# Altium integrated library MATE-ROV_LIB.IntLib: 59 symbols
Pins are listed as number, name and electrical type; pins without a type are passive.

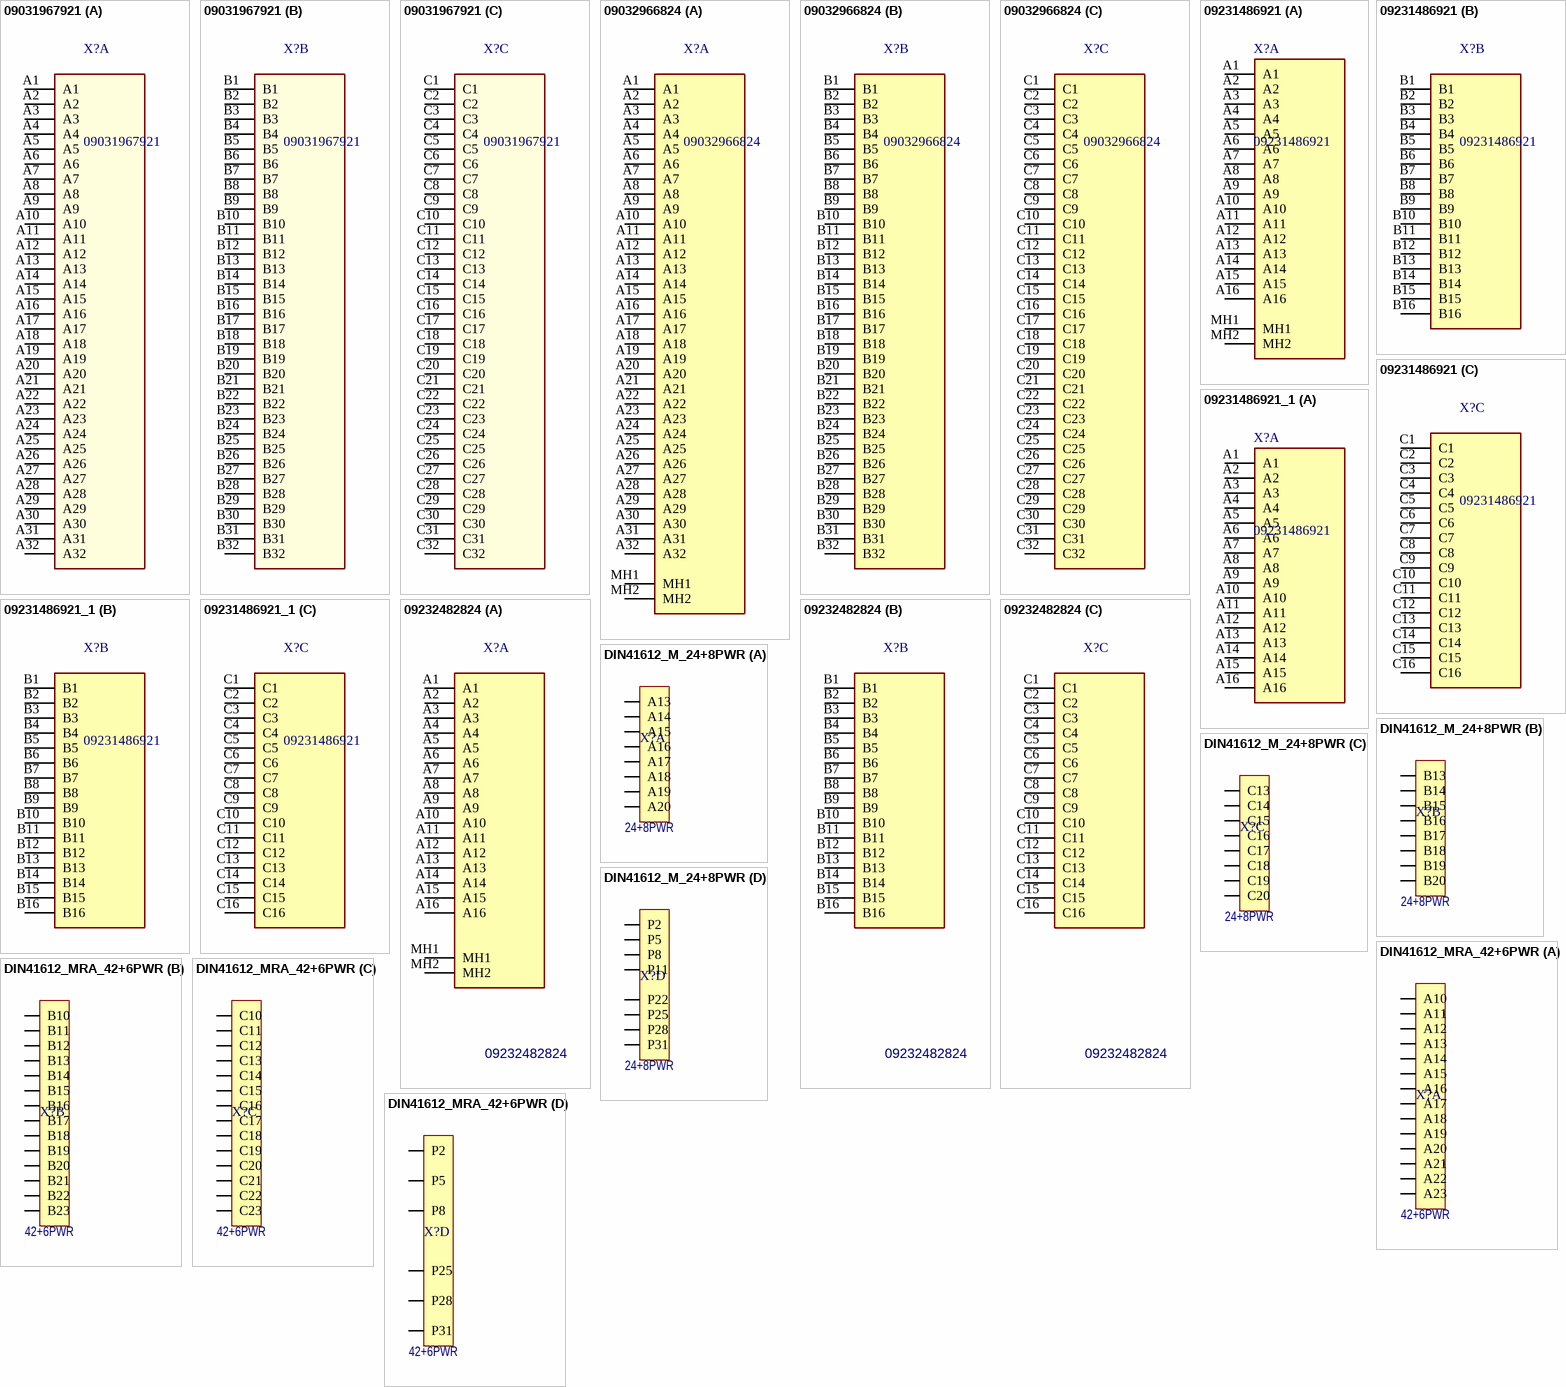
[diagram p0: symbols 09031967921 to DIN41612_MRA_42+6PWR]

## 09031967921
designator X?
DIN C male angled, 96pin, PL1, NFF F1-I2; Manufacturer: HARTING; Geometry.Height: 11.1mm; Ordering Number: 09031967921; Mouser Part Number: 617-09031962921222; Mouser Price/Stock: https://www.mouser.co.uk/ProductDetail/HARTING/09031962921222?qs=g4r0utqXwHHoAd6j7T8voA%3D%3D; Arrow Part Number: 09031962921222; Arrow Price/Stock: https://www.arrow.com/en/products/09031962921222/harting?region=nac; Datasheet Link: https://b2b.harting.com/files/download/PRD/PDF_DS/PDF_DS_09031220202.pdf
footprint 09031962921222
part A pins: A1, A2, A3, A4, A5, A6, A7, A8, A9, A10, A11, A12, A13, A14, A15, A16, A17, A18, A19, A20, A21, A22, A23, A24, A25, A26, A27, A28, A29, A30, A31, A32
part B pins: B1, B2, B3, B4, B5, B6, B7, B8, B9, B10, B11, B12, B13, B14, B15, B16, B17, B18, B19, B20, B21, B22, B23, B24, B25, B26, B27, B28, B29, B30, B31, B32
part C pins: C1, C2, C3, C4, C5, C6, C7, C8, C9, C10, C11, C12, C13, C14, C15, C16, C17, C18, C19, C20, C21, C22, C23, C24, C25, C26, C27, C28, C29, C30, C31, C32

## 09032966824
designator X?
DIN C female straight 96pin, 2.9mm tails, PL2; Manufacturer: HARTING; Geometry.Height: 11.6mm; Ordering Number: 09032966824; Mouser Part Number: 617-09-03-296-6824; Mouser Price/Stock: https://www.mouser.co.uk/ProductDetail/HARTING/09032966824?qs=UV5Tb6pF94W6%2F4%252Bfx4iLqQ%3D%3D; Arrow Part Number: 09032966824; Arrow Price/Stock: https://www.arrow.com/en/products/09032966824/harting?region=europe; Datasheet Link: https://b2b.harting.com/files/download/PRD/PDF_DS/PDF_DS_09032100001.pdf
footprint 09032966824
part A pins: A1, A2, A3, A4, A5, A6, A7, A8, A9, A10, A11, A12, A13, A14, A15, A16, A17, A18, A19, A20, A21, A22, A23, A24, A25, A26, A27, A28, A29, A30, A31, A32, MH1, MH2
part B pins: B1, B2, B3, B4, B5, B6, B7, B8, B9, B10, B11, B12, B13, B14, B15, B16, B17, B18, B19, B20, B21, B22, B23, B24, B25, B26, B27, B28, B29, B30, B31, B32
part C pins: C1, C2, C3, C4, C5, C6, C7, C8, C9, C10, C11, C12, C13, C14, C15, C16, C17, C18, C19, C20, C21, C22, C23, C24, C25, C26, C27, C28, C29, C30, C31, C32

## 09231486921
designator X?
DIN 2C male straight 48pin; Manufacturer: HARTING; Geometry.Height: 11mm; Ordering Number: 09231486921; Mouser Part Number: *; Mouser Price/Stock: *; Arrow Part Number: 09 23 148 6921; Arrow Price/Stock: https://www.arrow.com/en/products/09231486921/harting; Datasheet Link: https://www.arrow.com/en/products/09231486921/harting
footprint 09231486921
part A pins: A1, A2, A3, A4, A5, A6, A7, A8, A9, A10, A11, A12, A13, A14, A15, A16, MH1, MH2
part B pins: B1, B2, B3, B4, B5, B6, B7, B8, B9, B10, B11, B12, B13, B14, B15, B16
part C pins: C1, C2, C3, C4, C5, C6, C7, C8, C9, C10, C11, C12, C13, C14, C15, C16

## 09231486921_1
designator X?, comment 09231486921
DIN 2C male straight 48pin / Without Mounting Holes for screws.; Manufacturer: HARTING; Geometry.Height: 11mm; Ordering Number: 09231486921; Mouser Part Number: *; Mouser Price/Stock: *; Arrow Part Number: 09 23 148 6921; Arrow Price/Stock: https://www.arrow.com/en/products/09231486921/harting; Datasheet Link: https://www.arrow.com/en/products/09231486921/harting
footprint 09231486921 - no Mounting Holes
part A pins: A1, A2, A3, A4, A5, A6, A7, A8, A9, A10, A11, A12, A13, A14, A15, A16
part B pins: B1, B2, B3, B4, B5, B6, B7, B8, B9, B10, B11, B12, B13, B14, B15, B16
part C pins: C1, C2, C3, C4, C5, C6, C7, C8, C9, C10, C11, C12, C13, C14, C15, C16

## 09232482824
designator X?
DIN 2C female straight 48pin, 2.9mm tails, PL1; Manufacturer: HARTING; Geometry.Height: 11.6mm; Ordering Number: 09232482824; Mouser Part Number: 617-09232482824; Mouser Price/Stock: https://www.mouser.co.uk/ProductDetail/HARTING/09232482824?qs=Afqhj6cPmO8bPFy5EsJjEQ%3D%3D; Arrow Part Number: *; Arrow Price/Stock: *; Datasheet Link: https://b2b.harting.com/files/download/PRD/PDF_DS/PDF_DS_09032100001.pdf
footprint 09232482824
footprint Model Name (Model Description)
part A pins: A1, A2, A3, A4, A5, A6, A7, A8, A9, A10, A11, A12, A13, A14, A15, A16, MH1, MH2
part B pins: B1, B2, B3, B4, B5, B6, B7, B8, B9, B10, B11, B12, B13, B14, B15, B16
part C pins: C1, C2, C3, C4, C5, C6, C7, C8, C9, C10, C11, C12, C13, C14, C15, C16

## DIN41612_M_24+8PWR
designator X?, comment 24+8PWR
DIN 41612 Bauform M 24+8 Federleiste mit Powerkontakten; Manufacturer: Harting; € / St.: 54,00; Ordering Number: 09032246804 + 8x 09030006104; ComponentLink1Description: Datasheet; ComponentLink1URL: D:\Prj\_Altium\IntLib_leh2fe\DS\Harting\DIN41612_Steckverbinder.pdf; ComponentLink2URL: D:\Prj\_Altium\IntLib_leh2fe\DS\Harting\0903224X805_100072218DRW027A.pdf; ComponentLink2Description: Drawing1; Value: 24+8PWR
footprint DIN 41612 24+8 (Female Connector Type M 24+8)
part A pins: A13, A14, A15, A16, A17, A18, A19, A20
part B pins: B13, B14, B15, B16, B17, B18, B19, B20
part C pins: C13, C14, C15, C16, C17, C18, C19, C20
part D pins: 2 P2, 5 P5, 8 P8, 11 P11, 22 P22, 25 P25, 28 P28, 31 P31

## DIN41612_MRA_42+6PWR
designator X?, comment 42+6PWR
DIN 41612 Bauform M 42+6 Messerleiste mit Powerkontakten; Manufacturer: Harting; € / St.: 48,00; Ordering Number: 09031426901 + 6x 09030006104; ComponentLink1Description: Datasheet; ComponentLink1URL: D:\Prj\_Altium\IntLib_leh2fe\DS\Harting\DIN41612_Steckverbinder.pdf; ComponentLink2URL: D:\Prj\_Altium\IntLib_leh2fe\DS\Harting\Harting_DIN41612_Messerleiste_0903142X901.pdf; ComponentLink2Description: Drawing1; ComponentLink3Description: Drawing2; ComponentLink3URL: D:\Prj\_Altium\IntLib_leh2fe\DS\Harting\Harting_DIN41612_Kontakt_0903000X104.pdf; Value: 42+6PWR
footprint DIN41612_M_Messerleiste42+6 (Steckverbinder DIN 41 612 Bauform M Messerleiste 42+6 mit Hochstromkontakten)
part A pins: A10, A11, A12, A13, A14, A15, A16, A17, A18, A19, A20, A21, A22, A23
part B pins: B10, B11, B12, B13, B14, B15, B16, B17, B18, B19, B20, B21, B22, B23
part C pins: C10, C11, C12, C13, C14, C15, C16, C17, C18, C19, C20, C21, C22, C23
part D pins: P2, P5, P8, P25, P28, P31

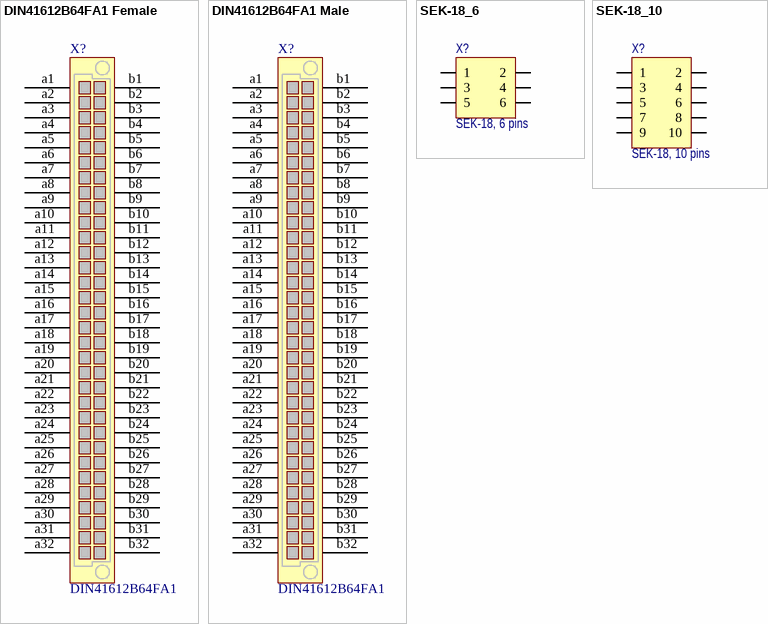
[diagram p1: symbols DIN41612B64FA1 Female to SEK-18_10]

## DIN41612B64FA1 Female
designator X?, comment DIN41612B64FA1
DIN 41612, IEC 60603-2, Anforderungsstufe 1; Manufacturer 1: Harting; Manufacturer Part Number 1: 09 02 264 2824; HelpUrl: http://datasheets/connector/harting/DIN41612B__0902264X824_100179617DRW028A.pdf
footprint HARTING_09_02_264_2824
pins: a1, a2, a3, a4, a5, a6, a7, a8, a9, a10, a11, a12, a13, a14, a15, a16, a17, a18, a19, a20, a21, a22, a23, a24, a25, a26, a27, a28, a29, a30, a31, a32, b1, b2, b3, b4, b5, b6, b7, b8, b9, b10, b11, b12, b13, b14, b15, b16, b17, b18, b19, b20, b21, b22, b23, b24, b25, b26, b27, b28, b29, b30, b31, b32

## DIN41612B64FA1 Male
designator X?, comment DIN41612B64FA1
DIN 41612, IEC 60603-2, Anforderungsstufe 1; Manufacturer 1: Harting; Manufacturer Part Number 1: 09 02 364 6921; HelpUrl: http://datasheets/connector/harting/DIN41612B__0902264X824_100179617DRW028A.pdf
footprint HARTING_09_02_364_6921
pins: a1, a2, a3, a4, a5, a6, a7, a8, a9, a10, a11, a12, a13, a14, a15, a16, a17, a18, a19, a20, a21, a22, a23, a24, a25, a26, a27, a28, a29, a30, a31, a32, b1, b2, b3, b4, b5, b6, b7, b8, b9, b10, b11, b12, b13, b14, b15, b16, b17, b18, b19, b20, b21, b22, b23, b24, b25, b26, b27, b28, b29, b30, b31, b32

## SEK-18_6
designator X?, comment SEK-18, 6 pins
Wannenstecker; Manufacturer: Harting; Part Number: 09 18 506 6324; Part ID: SEK-18_6; Price: 1,22; ComponentLink1Description: Datasheet; ComponentLink1URL: D:\Prj\_Altium\Lib\DbLib_Nieuwenhuizen\Datasheets\Harting\Harting_SEK-18_DS.pdf; Value: SEK-18, 6 pins
footprint Harting_SEK-18_6
pins: 1, 2, 3, 4, 5, 6

## SEK-18_10
designator X?, comment SEK-18, 10 pins
Wannenstecker; Manufacturer: Harting; Part Number: 09 18 510 6324; Part ID: SEK-18_10; Price: 1,48; ComponentLink1Description: Datasheet; ComponentLink1URL: D:\Prj\_Altium\Lib\DbLib_Nieuwenhuizen\Datasheets\Harting\Harting_SEK-18_DS.pdf; Value: SEK-18, 10 pins
footprint Harting_SEK-18_10
pins: 1, 2, 3, 4, 5, 6, 7, 8, 9, 10


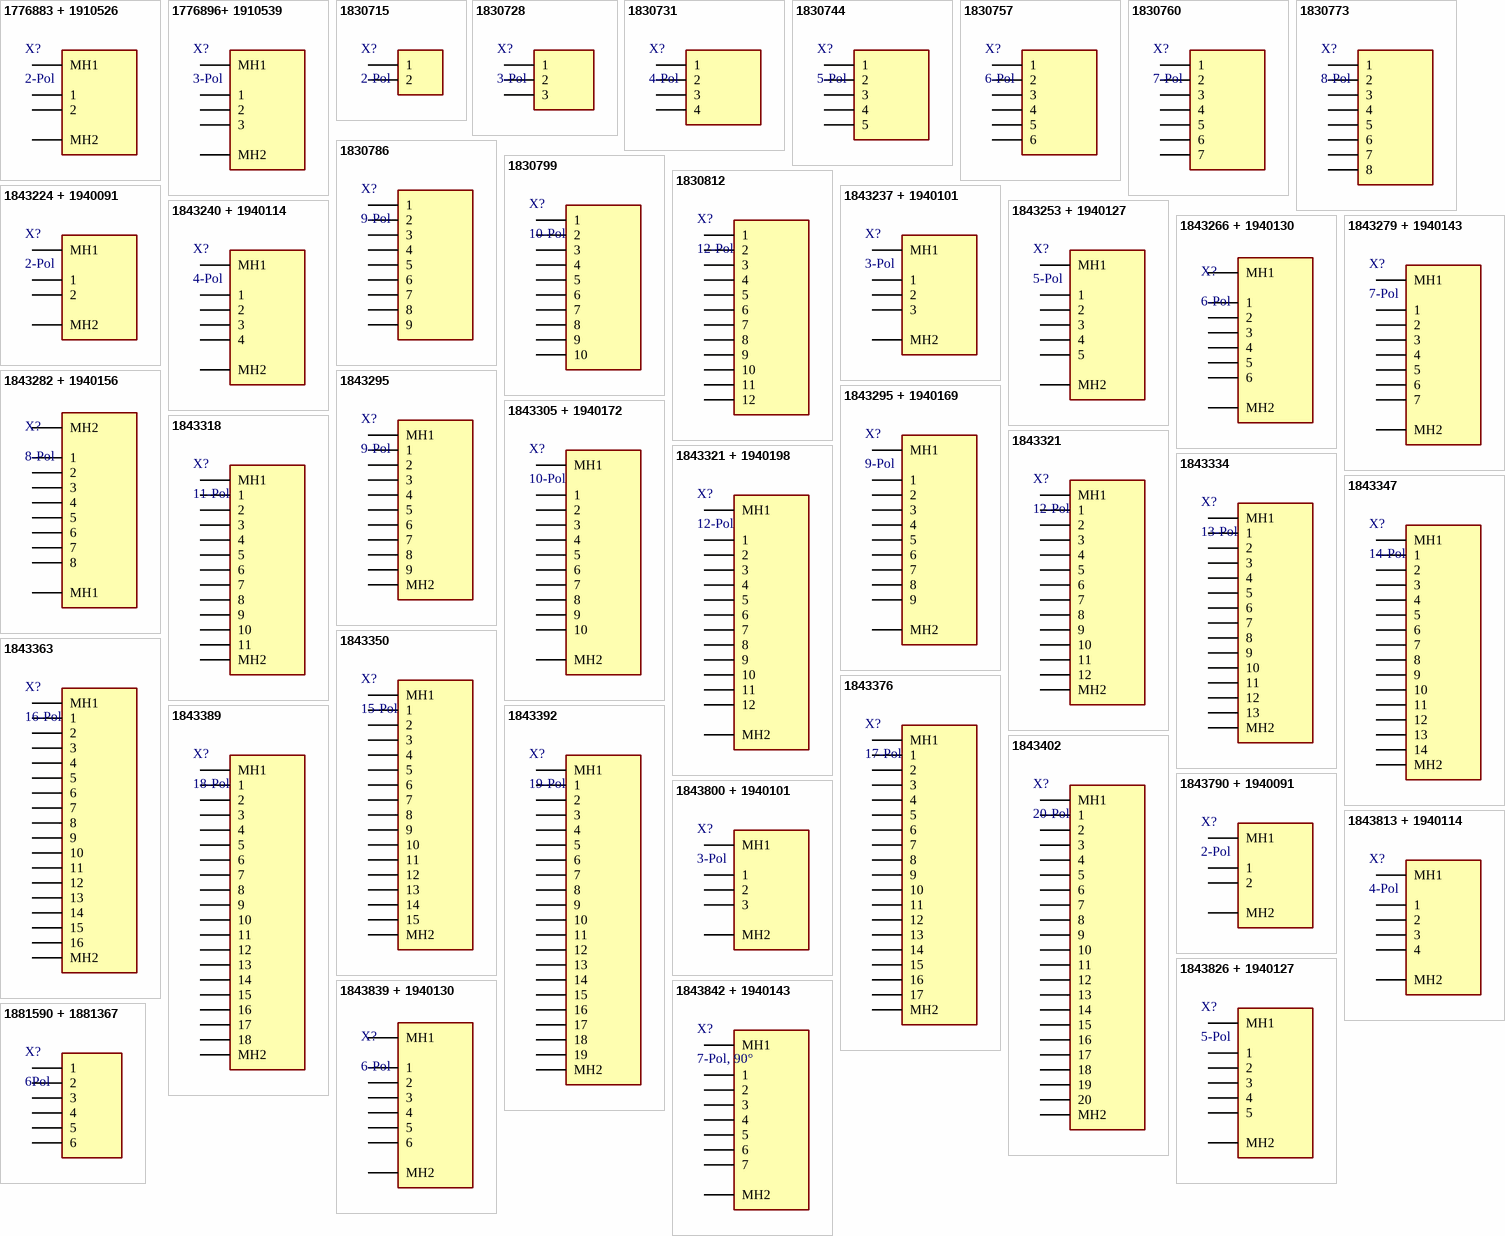
[diagram p2: symbols 1776883 + 1910526 to 1881590 + 1881367]

## 1776883 + 1910526
designator X?, comment 2-Pol
MSTBV 2,5/ 2-GF; Manufacturer: Phoenix Contact; Ordering Number: 1776883 + 1910526; Datasheet Link: https://pxc-crisp-production-platform-cr-s3downloadbucket-1rf23da6xdlmt.s3.eu-west-1.amazonaws.com/7581998?response-content-disposition=attachment%3B%20filename%20%3D%221776883_06_de_00.pdf%22&X-Amz-Algorithm=AWS4-HMAC-SHA256&X-Amz-Date=20230502T132623Z&X-Amz-SignedHeaders=host&X-Amz-Expires=10800&X-Amz-Credential=AKIAWWXX4BDRFPQUJUER%2F20230502%2Feu-west-1%2Fs3%2Faws4_request&X-Amz-Signature=93fda9201eaa23829656cda063376b60d5c1e41fd797b3d325ff711a1963ead9; Height: 15.9; Mouser Price/Stock: https://www.mouser.co.uk/ProductDetail/Phoenix-Contact/1843224?qs=W3wJikR1%252BS7TdfQo8aVAlQ%3D%3D; Arrow Part Number: 1843224; Arrow Price/Stock: https://www.arrow.com/en/products/1843224/phoenix-contact?region=nac
footprint 1776883 + 1910526
pins: 1, 2, MH1, MH2

## 1776896+ 1910539
designator X?, comment 3-Pol
MSTBV 2,5/ 3-GF; Manufacturer: Phoenix Contact; Ordering Number: 1776896+ 1910539; Datasheet Link: https://pxc-crisp-production-platform-cr-s3downloadbucket-1rf23da6xdlmt.s3.eu-west-1.amazonaws.com/7581998?response-content-disposition=attachment%3B%20filename%20%3D%221776883_06_de_00.pdf%22&X-Amz-Algorithm=AWS4-HMAC-SHA256&X-Amz-Date=20230502T132623Z&X-Amz-SignedHeaders=host&X-Amz-Expires=10800&X-Amz-Credential=AKIAWWXX4BDRFPQUJUER%2F20230502%2Feu-west-1%2Fs3%2Faws4_request&X-Amz-Signature=93fda9201eaa23829656cda063376b60d5c1e41fd797b3d325ff711a1963ead9; Height: 15.9; Mouser Price/Stock: https://www.mouser.co.uk/ProductDetail/Phoenix-Contact/1843224?qs=W3wJikR1%252BS7TdfQo8aVAlQ%3D%3D; Arrow Part Number: 1843224; Arrow Price/Stock: https://www.arrow.com/en/products/1843224/phoenix-contact?region=nac
footprint 1776896+ 1910539
pins: 1, 2, 3, MH1, MH2

## 1830715
designator X?, comment 2-Pol
IMCV 1,5/ 2-G-3,5 P20 THR; Manufacturer: Phoenix Contact; Ordering Number: 1830715; Datasheet Link: https://pxc-crisp-production-platform-cr-s3downloadbucket-1rf23da6xdlmt.s3.eu-west-1.amazonaws.com/7581998?response-content-disposition=attachment%3B%20filename%20%3D%221776883_06_de_00.pdf%22&X-Amz-Algorithm=AWS4-HMAC-SHA256&X-Amz-Date=20230502T132623Z&X-Amz-SignedHeaders=host&X-Amz-Expires=10800&X-Amz-Credential=AKIAWWXX4BDRFPQUJUER%2F20230502%2Feu-west-1%2Fs3%2Faws4_request&X-Amz-Signature=93fda9201eaa23829656cda063376b60d5c1e41fd797b3d325ff711a1963ead9; Height: 15.9; Mouser Price/Stock: https://www.mouser.co.uk/ProductDetail/Phoenix-Contact/1843224?qs=W3wJikR1%252BS7TdfQo8aVAlQ%3D%3D; Arrow Part Number: 1830715; Arrow Price/Stock: https://www.arrow.com/en/products/1843224/phoenix-contact?region=nac
footprint 1830715 IMCV 1,5/2-G-3,5 P20 THR
pins: 1, 2

## 1830728
designator X?, comment 3-Pol
IMCV 1,5/ 3-G-3,5 P20 THR; Manufacturer: Phoenix Contact; Ordering Number: 1830728; Datasheet Link: https://pxc-crisp-production-platform-cr-s3downloadbucket-1rf23da6xdlmt.s3.eu-west-1.amazonaws.com/7581998?response-content-disposition=attachment%3B%20filename%20%3D%221776883_06_de_00.pdf%22&X-Amz-Algorithm=AWS4-HMAC-SHA256&X-Amz-Date=20230502T132623Z&X-Amz-SignedHeaders=host&X-Amz-Expires=10800&X-Amz-Credential=AKIAWWXX4BDRFPQUJUER%2F20230502%2Feu-west-1%2Fs3%2Faws4_request&X-Amz-Signature=93fda9201eaa23829656cda063376b60d5c1e41fd797b3d325ff711a1963ead9; Height: 15.9; Mouser Price/Stock: https://www.mouser.co.uk/ProductDetail/Phoenix-Contact/1843224?qs=W3wJikR1%252BS7TdfQo8aVAlQ%3D%3D; Arrow Part Number: 1830715; Arrow Price/Stock: https://www.arrow.com/en/products/1843224/phoenix-contact?region=nac
footprint 1830728 IMCV 1,5/3-G-3,5 P20 THR
pins: 1, 2, 3

## 1830731
designator X?, comment 4-Pol
IMCV 1,5/ 4-G-3,5 P20 THR; Manufacturer: Phoenix Contact; Ordering Number: 1830731; Datasheet Link: https://pxc-crisp-production-platform-cr-s3downloadbucket-1rf23da6xdlmt.s3.eu-west-1.amazonaws.com/7581998?response-content-disposition=attachment%3B%20filename%20%3D%221776883_06_de_00.pdf%22&X-Amz-Algorithm=AWS4-HMAC-SHA256&X-Amz-Date=20230502T132623Z&X-Amz-SignedHeaders=host&X-Amz-Expires=10800&X-Amz-Credential=AKIAWWXX4BDRFPQUJUER%2F20230502%2Feu-west-1%2Fs3%2Faws4_request&X-Amz-Signature=93fda9201eaa23829656cda063376b60d5c1e41fd797b3d325ff711a1963ead9; Height: 15.9; Mouser Price/Stock: https://www.mouser.co.uk/ProductDetail/Phoenix-Contact/1843224?qs=W3wJikR1%252BS7TdfQo8aVAlQ%3D%3D; Arrow Part Number: 1830715; Arrow Price/Stock: https://www.arrow.com/en/products/1843224/phoenix-contact?region=nac
footprint 1830731 IMCV 1,5/4-G-3,5 P20 THR
pins: 1, 2, 3, 4

## 1830744
designator X?, comment 5-Pol
IMCV 1,5/ 5-G-3,5 P20 THR; Manufacturer: Phoenix Contact; Ordering Number: 1830744; Datasheet Link: https://pxc-crisp-production-platform-cr-s3downloadbucket-1rf23da6xdlmt.s3.eu-west-1.amazonaws.com/7581998?response-content-disposition=attachment%3B%20filename%20%3D%221776883_06_de_00.pdf%22&X-Amz-Algorithm=AWS4-HMAC-SHA256&X-Amz-Date=20230502T132623Z&X-Amz-SignedHeaders=host&X-Amz-Expires=10800&X-Amz-Credential=AKIAWWXX4BDRFPQUJUER%2F20230502%2Feu-west-1%2Fs3%2Faws4_request&X-Amz-Signature=93fda9201eaa23829656cda063376b60d5c1e41fd797b3d325ff711a1963ead9; Height: 15.9; Mouser Price/Stock: https://www.mouser.co.uk/ProductDetail/Phoenix-Contact/1843224?qs=W3wJikR1%252BS7TdfQo8aVAlQ%3D%3D; Arrow Part Number: 1830715; Arrow Price/Stock: https://www.arrow.com/en/products/1843224/phoenix-contact?region=nac
footprint 1830744 IMCV 1,5/5-G-3,5 P20 THR
pins: 1, 2, 3, 4, 5

## 1830757
designator X?, comment 6-Pol
IMCV 1,5/ 6-G-3,5 P20 THR; Manufacturer: Phoenix Contact; Ordering Number: 1830757; Datasheet Link: https://pxc-crisp-production-platform-cr-s3downloadbucket-1rf23da6xdlmt.s3.eu-west-1.amazonaws.com/7581998?response-content-disposition=attachment%3B%20filename%20%3D%221776883_06_de_00.pdf%22&X-Amz-Algorithm=AWS4-HMAC-SHA256&X-Amz-Date=20230502T132623Z&X-Amz-SignedHeaders=host&X-Amz-Expires=10800&X-Amz-Credential=AKIAWWXX4BDRFPQUJUER%2F20230502%2Feu-west-1%2Fs3%2Faws4_request&X-Amz-Signature=93fda9201eaa23829656cda063376b60d5c1e41fd797b3d325ff711a1963ead9; Height: 15.9; Mouser Price/Stock: https://www.mouser.co.uk/ProductDetail/Phoenix-Contact/1843224?qs=W3wJikR1%252BS7TdfQo8aVAlQ%3D%3D; Arrow Part Number: 1830715; Arrow Price/Stock: https://www.arrow.com/en/products/1843224/phoenix-contact?region=nac
footprint 1830757 IMCV 1,5/6-G-3,5 P20 THR
pins: 1, 2, 3, 4, 5, 6

## 1830760
designator X?, comment 7-Pol
IMCV 1,5/ 7-G-3,5 P20 THR; Manufacturer: Phoenix Contact; Ordering Number: 1830760; Datasheet Link: https://pxc-crisp-production-platform-cr-s3downloadbucket-1rf23da6xdlmt.s3.eu-west-1.amazonaws.com/7581998?response-content-disposition=attachment%3B%20filename%20%3D%221776883_06_de_00.pdf%22&X-Amz-Algorithm=AWS4-HMAC-SHA256&X-Amz-Date=20230502T132623Z&X-Amz-SignedHeaders=host&X-Amz-Expires=10800&X-Amz-Credential=AKIAWWXX4BDRFPQUJUER%2F20230502%2Feu-west-1%2Fs3%2Faws4_request&X-Amz-Signature=93fda9201eaa23829656cda063376b60d5c1e41fd797b3d325ff711a1963ead9; Height: 15.9; Mouser Price/Stock: https://www.mouser.co.uk/ProductDetail/Phoenix-Contact/1843224?qs=W3wJikR1%252BS7TdfQo8aVAlQ%3D%3D; Arrow Part Number: 1830715; Arrow Price/Stock: https://www.arrow.com/en/products/1843224/phoenix-contact?region=nac
footprint 1830760 IMCV 1,5/7-G-3,5 P20 THR
pins: 1, 2, 3, 4, 5, 6, 7

## 1830773
designator X?, comment 8-Pol
IMCV 1,5/ 8-G-3,5 P20 THR; Manufacturer: Phoenix Contact; Ordering Number: 1830773; Datasheet Link: https://pxc-crisp-production-platform-cr-s3downloadbucket-1rf23da6xdlmt.s3.eu-west-1.amazonaws.com/7581998?response-content-disposition=attachment%3B%20filename%20%3D%221776883_06_de_00.pdf%22&X-Amz-Algorithm=AWS4-HMAC-SHA256&X-Amz-Date=20230502T132623Z&X-Amz-SignedHeaders=host&X-Amz-Expires=10800&X-Amz-Credential=AKIAWWXX4BDRFPQUJUER%2F20230502%2Feu-west-1%2Fs3%2Faws4_request&X-Amz-Signature=93fda9201eaa23829656cda063376b60d5c1e41fd797b3d325ff711a1963ead9; Height: 15.9; Mouser Price/Stock: https://www.mouser.co.uk/ProductDetail/Phoenix-Contact/1843224?qs=W3wJikR1%252BS7TdfQo8aVAlQ%3D%3D; Arrow Part Number: 1830715; Arrow Price/Stock: https://www.arrow.com/en/products/1843224/phoenix-contact?region=nac
footprint 1830773 IMCV 1,5/8-G-3,5 P20 THR
pins: 1, 2, 3, 4, 5, 6, 7, 8

## 1830786
designator X?, comment 9-Pol
IMCV 1,5/ 9-G-3,5 P20 THR; Manufacturer: Phoenix Contact; Ordering Number: 1830786; Datasheet Link: https://pxc-crisp-production-platform-cr-s3downloadbucket-1rf23da6xdlmt.s3.eu-west-1.amazonaws.com/7581998?response-content-disposition=attachment%3B%20filename%20%3D%221776883_06_de_00.pdf%22&X-Amz-Algorithm=AWS4-HMAC-SHA256&X-Amz-Date=20230502T132623Z&X-Amz-SignedHeaders=host&X-Amz-Expires=10800&X-Amz-Credential=AKIAWWXX4BDRFPQUJUER%2F20230502%2Feu-west-1%2Fs3%2Faws4_request&X-Amz-Signature=93fda9201eaa23829656cda063376b60d5c1e41fd797b3d325ff711a1963ead9; Height: 15.9; Mouser Price/Stock: https://www.mouser.co.uk/ProductDetail/Phoenix-Contact/1843224?qs=W3wJikR1%252BS7TdfQo8aVAlQ%3D%3D; Arrow Part Number: 1830715; Arrow Price/Stock: https://www.arrow.com/en/products/1843224/phoenix-contact?region=nac
footprint 1830786 IMCV 1,5/9-G-3,5 P20 THR
pins: 1, 2, 3, 4, 5, 6, 7, 8, 9

## 1830799
designator X?, comment 10-Pol
IMCV 1,5/ 10-G-3,5 P20 THR; Manufacturer: Phoenix Contact; Ordering Number: 1830799; Datasheet Link: https://pxc-crisp-production-platform-cr-s3downloadbucket-1rf23da6xdlmt.s3.eu-west-1.amazonaws.com/7581998?response-content-disposition=attachment%3B%20filename%20%3D%221776883_06_de_00.pdf%22&X-Amz-Algorithm=AWS4-HMAC-SHA256&X-Amz-Date=20230502T132623Z&X-Amz-SignedHeaders=host&X-Amz-Expires=10800&X-Amz-Credential=AKIAWWXX4BDRFPQUJUER%2F20230502%2Feu-west-1%2Fs3%2Faws4_request&X-Amz-Signature=93fda9201eaa23829656cda063376b60d5c1e41fd797b3d325ff711a1963ead9; Height: 15.9; Mouser Price/Stock: https://www.mouser.co.uk/ProductDetail/Phoenix-Contact/1843224?qs=W3wJikR1%252BS7TdfQo8aVAlQ%3D%3D; Arrow Part Number: 1830715; Arrow Price/Stock: https://www.arrow.com/en/products/1843224/phoenix-contact?region=nac
footprint 1830799 IMCV 1,5/10-G-3,5 P20 THR
pins: 1, 2, 3, 4, 5, 6, 7, 8, 9, 10

## 1830812
designator X?, comment 12-Pol
IMCV 1,5/ 12-G-3,5 P20 THR; Manufacturer: Phoenix Contact; Ordering Number: 1830812; Datasheet Link: https://pxc-crisp-production-platform-cr-s3downloadbucket-1rf23da6xdlmt.s3.eu-west-1.amazonaws.com/7581998?response-content-disposition=attachment%3B%20filename%20%3D%221776883_06_de_00.pdf%22&X-Amz-Algorithm=AWS4-HMAC-SHA256&X-Amz-Date=20230502T132623Z&X-Amz-SignedHeaders=host&X-Amz-Expires=10800&X-Amz-Credential=AKIAWWXX4BDRFPQUJUER%2F20230502%2Feu-west-1%2Fs3%2Faws4_request&X-Amz-Signature=93fda9201eaa23829656cda063376b60d5c1e41fd797b3d325ff711a1963ead9; Height: 14,45; Mouser Price/Stock: https://www.mouser.co.uk/ProductDetail/Phoenix-Contact/1843224?qs=W3wJikR1%252BS7TdfQo8aVAlQ%3D%3D; Arrow Part Number: 1830715; Arrow Price/Stock: https://www.arrow.com/en/products/1843224/phoenix-contact?region=nac
footprint 1830812 IMCV 1,5/12-G-3,5 P20 THR
pins: 1, 2, 3, 4, 5, 6, 7, 8, 9, 10, 11, 12

## 1843224 + 1940091
designator X?, comment 2-Pol
MCV 1,5/ 2-GF-3,5 + FK-MCP 1,5/ 2-STF-3,5; Manufacturer: Phoenix Contact; Ordering Number: 1843224 + 1940091; Datasheet Link: https://datasheet.datasheetarchive.com/originals/distributors/SFDatasheet-2/sf-00054479.pdf; Height: 9.2mm; Mouser Part Number: 651-1843224; Mouser Price/Stock: https://www.mouser.co.uk/ProductDetail/Phoenix-Contact/1843224?qs=W3wJikR1%252BS7TdfQo8aVAlQ%3D%3D; Arrow Part Number: 1843224; Arrow Price/Stock: https://www.arrow.com/en/products/1843224/phoenix-contact?region=nac
footprint 1843224 MCV 1,5/ 2-GF-3,5
pins: 1, 2, MH1, MH2

## 1843237 + 1940101
designator X?, comment 3-Pol
MCV 1,5/ 3-GF-3,5; Manufacturer: Phoenix Contact; Ordering Number: 1843237 + 1940101; Datasheet Link: https://datasheet.datasheetarchive.com/originals/distributors/SFDatasheet-2/sf-00054480.pdf; Height: 9.35mm; Mouser Part Number: 651-1843237; Mouser Price/Stock: https://www.mouser.co.uk/ProductDetail/Phoenix-Contact/1843237?qs=QWULklcAmSRz%2FPKCcOFzew%3D%3D; Arrow Part Number: 1843237; Arrow Price/Stock: https://www.arrow.com/en/products/1843237/phoenix-contact
footprint 1843237 MCV 1,5/ 3-GF-3,5
pins: 1, 2, 3, MH1, MH2

## 1843240 + 1940114
designator X?, comment 4-Pol
MCV 1,5/ 4-GF-3,5; Manufacturer: Phoenix Contact; Ordering_Number: 1843240 + 1940114; Datasheet Link: https://datasheet.datasheetarchive.com/originals/distributors/SFDatasheet-2/sf-00054481.pdf; Height: 9.2mm; Mouser Part Number: 651-1843240; Mouser Price/Stock: https://www.mouser.co.uk/ProductDetail/Phoenix-Contact/1843240?qs=W3wJikR1%252BS4UV948sQ%2FfDQ%3D%3D; Arrow Part Number: 1843240; Arrow Price/Stock: https://www.arrow.com/en/products/1843240/phoenix-contact?region=nac
footprint 1843240 MCV 1,5/ 4-GF-3,5
pins: 1, 2, 3, 4, MH1, MH2

## 1843253 + 1940127
designator X?, comment 5-Pol
MCV 1,5/ 5-GF-3,5 + FK-MCP 1,5/ 5-STF-3,5; Manufacturer: Phoenix Contact; Ordering Number: 1843253 + 1940127; Datasheet Link: https://datasheet.datasheetarchive.com/originals/distributors/Datasheets-DGA26/1813160.pdf; Height: 9.35mm; Mouser Part Number: 651-1843253; Mouser Price/Stock: https://www.mouser.co.uk/ProductDetail/Phoenix-Contact/1843253?qs=qDEY8L%2Fo3POXxLCZiJq8WA%3D%3D; Arrow Part Number: 1843253; Arrow Price/Stock: https://www.arrow.com/en/products/1843253/phoenix-contact
footprint 1843253 MCV 1,5/ 5-GF-3,5
pins: 1, 2, 3, 4, 5, MH1, MH2

## 1843266 + 1940130
designator X?, comment 6-Pol
MCV 1,5/ 6-GF-3,5 + FK-MCP 1,5/ 6-STF-3,5; Manufacturer: Phoenix Contact; Ordering Number: 1843266 + 1940130; Datasheet Link: https://www.phoenixcontact.com/online/portal/pi/pxc/product_detail_page/!ut/p/z1/5VdNT-MwEP0r3UNvuHa-3WMJXShQtqi0NLlETjLpms0XiWmBX792m1VVBOGAOKwSWantzDzPe56pNNjHK-znbMPXTPAiZ6lce74dUP3KvTg3tSkxLyi5vZldj25vZ4Y-0vES-9ivIYVIQOwyAeuiesHe6PpafRAsxJ6uZmUU_cHeDG
footprint 1843266 MCV 1,5/ 6-GF-3,5 + FK-MCP 1,5/ 6-STF-3,5
pins: 1, 2, 3, 4, 5, 6, MH1, MH2

## 1843279 + 1940143
designator X?, comment 7-Pol
MCV 1,5/ 7-GF-3,5; Manufacturer: Phoenix Contact; Ordering Number: 1843279 + 1940143; Datasheet Link: https://www.phoenixcontact.com/online/portal/pi/pxc/product_detail_page/!ut/p/z1/5VdLT-MwEP4r3UNvuHbe7rGEAgUKRaXQ5BI5yaRrNi8S0wK_fu02qwpUwgFxWCWyEj9mPvv7PBNpsI-X2M_Zmq-Y4EXOUjn2fDug-qV7fmZqU2KeU3J7Pbsa3d7ODH2k43vsY7-GFCIBscsErIrqFXujqyu1IFiIPV31yij6g70Z0j; Height: 9.35mm; Arrow Part Number: 1843279; Arrow Price/Stock: https://www.arrow.com/en/products/1843279/phoenix-contact
footprint 1843279 MCV 1,5/ 7-GF-3,5
pins: 1, 2, 3, 4, 5, 6, 7, MH1, MH2

## 1843282 + 1940156
designator X?, comment 8-Pol
MCV 1,5/ 8-GF-3,5; Manufacturer: Phoenix Contact; Ordering Number: 1843282 +; Datasheet Link: https://datasheet.datasheetarchive.com/originals/distributors/SFDatasheet-2/sf-00054485.pdf; Height: 9.35mm; Mouser Part Number: 651-1843282; Mouser Price/Stock: https://www.mouser.co.uk/ProductDetail/Phoenix-Contact/1843282?qs=QWULklcAmSTLfGtPADlbSQ%3D%3D; Arrow Part Number: 1843282; Arrow Price/Stock: https://www.arrow.com/en/products/1843282/phoenix-contact
footprint 1843282 MCV 1,5/ 8-GF-3,5
pins: 1, 2, 3, 4, 5, 6, 7, 8, MH1, MH2

## 1843295
designator X?, comment 9-Pol
MCV 1,5/ 9-GF-3,5; Manufacturer: Phoenix Contact; Ordering Number: 1843295; Datasheet Link: http://www.phoenixcontact.com/de/produkte/1843295/pdf; Height: 9.35mm; Mouser Part Number: 651-1843295; Mouser Price/Stock: https://www.mouser.co.uk/ProductDetail/Phoenix-Contact/1843295?qs=qDEY8L%2Fo3PNnpW9tKLaRww%3D%3D; Arrow Part Number: 1843295; Arrow Price/Stock: https://www.arrow.com/en/products/1843295/phoenix-contact
footprint 1843295 MCV 1,5/ 9-GF-3,5
pins: 1, 2, 3, 4, 5, 6, 7, 8, 9, MH1, MH2

## 1843295 + 1940169
designator X?, comment 9-Pol
MCV 1,5/ 9-GF-3,5; Manufacturer: Phoenix Contact; Ordering Number: 1843295 + 1940169; Datasheet Link: http://www.phoenixcontact.com/de/produkte/1843295/pdf; Height: 9.35mm; Mouser Part Number: 651-1843295; Mouser Price/Stock: https://www.mouser.co.uk/ProductDetail/Phoenix-Contact/1843295?qs=qDEY8L%2Fo3PNnpW9tKLaRww%3D%3D; Arrow Part Number: 1843295; Arrow Price/Stock: https://www.arrow.com/en/products/1843295/phoenix-contact
footprint 1843295 + 1940169MCV 1,5/ 9-GF-3,5
pins: 1, 2, 3, 4, 5, 6, 7, 8, 9, MH1, MH2

## 1843305 + 1940172
designator X?, comment 10-Pol
MCV 1,5/10-GF-3,5; Manufacturer: Phoenix Contact; Ordering Number: 1843305 + 1940172; Datasheet Link: https://componentsearchengine.com/Datasheets/1/1843305.pdf; Height: 9.35mm; Mouser Part Number: 651-1843305; Mouser Price/Stock: https://www.mouser.co.uk/ProductDetail/Phoenix-Contact/1843305?qs=t%252BrwbUv0m%252BzKFslnE2jFTw%3D%3D; Arrow Part Number: 1843305; Arrow Price/Stock: https://www.arrow.com/en/products/1843305/phoenix-contact
footprint 1843305 MCV 1,5/ 10-GF-3,5
pins: 1, 2, 3, 4, 5, 6, 7, 8, 9, 10, MH1, MH2

## 1843318
designator X?, comment 11-Pol
MCV 1,5/11-GF-3,5; Manufacturer: Phoenix Contact; Ordering Number: 1843318; Datasheet Link: https://datasheet.datasheetarchive.com/originals/distributors/SFDatasheet-2/sf-00054488.pdf; Height: 9.35mm; Mouser Part Number: 651-1843318; Mouser Price/Stock: https://www.mouser.com/Search/Refine.aspx?Keyword=651-1843318; Arrow Part Number: 1843318; Arrow Price/Stock: https://www.arrow.com/en/products/1843318/phoenix-contact
footprint 1843318 MCV 1,5/ 11-GF-3,5
pins: 1, 2, 3, 4, 5, 6, 7, 8, 9, 10, 11, MH1, MH2

## 1843321
designator X?, comment 12-Pol
MCV 1,5/12-GF-3,5; Manufacturer: Phoenix Contact; Ordering Number: 1843321; Datasheet Link: https://media.digikey.com/pdf/Data%20Sheets/Phoenix%20Contact%20PDFs/1843321.pdf; Height: 18.7mm; Mouser Part Number: 651-1843321; Mouser Price/Stock: https://www.mouser.co.uk/ProductDetail/Phoenix-Contact/1843321?qs=2%252BM72CStpDQB8qC9t4j80g%3D%3D; Arrow Part Number: 1843321; Arrow Price/Stock: https://www.arrow.com/en/products/1843321/phoenix-contact?region=nac
footprint 1843321 MCV 1,5/ 12-GF-3,5
pins: 1, 2, 3, 4, 5, 6, 7, 8, 9, 10, 11, 12, MH1, MH2

## 1843321 + 1940198
designator X?, comment 12-Pol
MCV 1,5/12-GF-3,5 + FK-MCP 1,5/ 6-STF-3,5; Manufacturer: Phoenix Contact; Ordering Number: 1843321 + 1940198; Height: 18.7mm
footprint 1843321  MCV 1,5/12-GF-3,5
pins: 1, 2, 3, 4, 5, 6, 7, 8, 9, 10, 11, 12, MH1, MH2

## 1843334
designator X?, comment 13-Pol
MCV 1,5/13-GF-3,5; Manufacturer: Phoenix Contact; Ordering Number: 1843334; Datasheet Link: https://www.phoenixcontact.com/online/portal/pi/?uri=pxc-oc-itemdetail:pid=1843334&library=pien&pcck=P-11-02-11&tab=2&selectedCategory=ALL; Height: 9.35mm; Mouser Part Number: 651-1843334; Mouser Price/Stock: https://www.mouser.co.uk/ProductDetail/Phoenix-Contact/1843334?qs=%2F0TLcleVf6SFNqj0Q1fyKw%3D%3D
footprint 1843334 MCV 1,5/ 13-GF-3,5
pins: 1, 2, 3, 4, 5, 6, 7, 8, 9, 10, 11, 12, 13, MH1, MH2

## 1843347
designator X?, comment 14-Pol
MCV 1,5/16-GF-3,5; Manufacturer: Phoenix Contact; Ordering Number: 1843347; Datasheet Link: https://componentsearchengine.com/Datasheets/1/1843347.pdf; Height: 9.35mm; Mouser Part Number: 651-1843347; Mouser Price/Stock: https://www.mouser.com/Search/Refine.aspx?Keyword=651-1843347; Arrow Part Number: 1843347; Arrow Price/Stock: https://www.arrow.com/en/products/1843347/phoenix-contact
footprint 1843363 MCV 1,5/ 16-GF-3,5
pins: 1, 2, 3, 4, 5, 6, 7, 8, 9, 10, 11, 12, 13, 14, MH1, MH2

## 1843350
designator X?, comment 15-Pol
MCV 1,5/15-GF-3,5; Manufacturer: Phoenix Contact; Ordering Number: 1843350; Datasheet Link: http://www.phoenixcontact.com/de/produkte/1843350/pdf; Height: 9.35mm; Mouser Part Number: 651-1843350; Mouser Price/Stock: https://www.mouser.com/Search/Refine.aspx?Keyword=651-1843350; Arrow Part Number: 1843350; Arrow Price/Stock: https://www.arrow.com/en/products/1843350/phoenix-contact
footprint 1843350 MCV 1,5/ 15-GF-3,5
pins: 1, 2, 3, 4, 5, 6, 7, 8, 9, 10, 11, 12, 13, 14, 15, MH1, MH2

## 1843363
designator X?, comment 16-Pol
MCV 1,5/16-GF-3,5; Manufacturer: Phoenix Contact; Ordering Number: 1843363; Datasheet Link: http://www.phoenixcontact.com/de/produkte/1843363/pdf; Height: 9.35mm; Mouser Part Number: 651-1843363; Mouser Price/Stock: https://www.mouser.co.uk/ProductDetail/Phoenix-Contact/1843363?qs=2%252BM72CStpDRUjwKytP%2FNkw%3D%3D; Arrow Part Number: 1843363; Arrow Price/Stock: https://www.arrow.com/en/products/1843363/phoenix-contact
footprint 1843363 MCV 1,5/ 16-GF-3,5
pins: 1, 2, 3, 4, 5, 6, 7, 8, 9, 10, 11, 12, 13, 14, 15, 16, MH1, MH2

## 1843376
designator X?, comment 17-Pol
MCV 1,5/17-GF-3,5; Manufacturer: Phoenix Contact; Ordering Number: 1843376; Datasheet Link: http://www.phoenixcontact.com/de/produkte/1843376/pdf; Height: 9.35mm; Mouser Part Number: 651-1843376; Mouser Price/Stock: https://www.mouser.com/Search/Refine.aspx?Keyword=651-1843376; Arrow Part Number: 1843376; Arrow Price/Stock: https://www.arrow.com/en/products/1843376/phoenix-contact
footprint 1843376 MCV 1,5/ 17-GF-3,5
pins: 1, 2, 3, 4, 5, 6, 7, 8, 9, 10, 11, 12, 13, 14, 15, 16, 17, MH1, MH2

## 1843389
designator X?, comment 18-Pol
MCV 1,5/18-GF-3,5; Manufacturer: Phoenix Contact; Ordering Number: 1843389; Datasheet Link: http://www.phoenixcontact.com/de/produkte/1843389/pdf; Height: 9.35mm; Mouser Part Number: 651-1843389; Mouser Price/Stock: https://www.mouser.com/Search/Refine.aspx?Keyword=651-1843389; Arrow Part Number: 1843389; Arrow Price/Stock: https://www.arrow.com/en/products/1843389/phoenix-contact
footprint 1843389 MCV 1,5/ 18-GF-3,5
pins: 1, 2, 3, 4, 5, 6, 7, 8, 9, 10, 11, 12, 13, 14, 15, 16, 17, 18, MH1, MH2

## 1843392
designator X?, comment 19-Pol
MCV 1,5/19-GF-3,5; Manufacturer: Phoenix Contact; Ordering Number: 1843392; Datasheet Link: https://www.phoenixcontact.com/en-ie/products/pcb-header-mcv-1519-gf-35-1843392#; Height: 9.35mm; Arrow Part Number: 1843392; Arrow Price/Stock: https://www.arrow.com/en/products/1843392/phoenix-contact
footprint 1843392 MCV 1,5/ 19-GF-3,5
pins: 1, 2, 3, 4, 5, 6, 7, 8, 9, 10, 11, 12, 13, 14, 15, 16, 17, 18, 19, MH1, MH2

## 1843402
designator X?, comment 20-Pol
MCV 1,5/20-GF-3,5; Manufacturer: Phoenix Contact; Ordering Number: 1843402; Datasheet Link: http://www.phoenixcontact.com/de/produkte/1843402/pdf; Height: 9.35mm
footprint 1843402 MCV 1,5/ 20-GF-3,5
pins: 1, 2, 3, 4, 5, 6, 7, 8, 9, 10, 11, 12, 13, 14, 15, 16, 17, 18, 19, 20, MH1, MH2

## 1843790 + 1940091
designator X?, comment 2-Pol
MC 1,5/ 2-GF-3,5 + FK-MCP 1,5/ 2-STF-3,5; Manufacturer: Phoenix Contact; Ordering Number: 1843790 + 1940091; Datasheet Link: https://datasheet.datasheetarchive.com/originals/distributors/SFDatasheet-2/sf-00054479.pdf; Height: 9.2mm; Mouser Part Number: 651-1843224; Mouser Price/Stock: https://www.mouser.co.uk/ProductDetail/Phoenix-Contact/1843224?qs=W3wJikR1%252BS7TdfQo8aVAlQ%3D%3D; Arrow Part Number: 1843224; Arrow Price/Stock: https://www.arrow.com/en/products/1843224/phoenix-contact?region=nac
footprint 1843790
pins: 1, 2, MH1, MH2

## 1843800 + 1940101
designator X?, comment 3-Pol
MC 1,5/ 3-GF-3,5+ FK-MCP 1,5/ 3-STF-3,5; Manufacturer: Phoenix Contact; Ordering Number: 1843800 + 1940101; Datasheet Link: https://datasheet.datasheetarchive.com/originals/distributors/SFDatasheet-2/sf-00054480.pdf; Height: 9.35mm; Mouser Part Number: 651-1843237; Mouser Price/Stock: https://www.mouser.co.uk/ProductDetail/Phoenix-Contact/1843237?qs=QWULklcAmSRz%2FPKCcOFzew%3D%3D; Arrow Part Number: 1843237; Arrow Price/Stock: https://www.arrow.com/en/products/1843237/phoenix-contact
footprint 1843800
pins: 1, 2, 3, MH1, MH2

## 1843813 + 1940114
designator X?, comment 4-Pol
MC 1,5/ 4-GF-3,5 + FK-MCP 1,5/ 4-STF-3,5; Manufacturer: Phoenix Contact; Ordering_Number: 1843813 + 1940114; Datasheet Link: https://datasheet.datasheetarchive.com/originals/distributors/SFDatasheet-2/sf-00054481.pdf; Height: 9.2mm; Mouser Part Number: 651-1843240; Mouser Price/Stock: https://www.mouser.co.uk/ProductDetail/Phoenix-Contact/1843240?qs=W3wJikR1%252BS4UV948sQ%2FfDQ%3D%3D; Arrow Part Number: 1843240; Arrow Price/Stock: https://www.arrow.com/en/products/1843240/phoenix-contact?region=nac
footprint 1843813
pins: 1, 2, 3, 4, MH1, MH2

## 1843826 + 1940127
designator X?, comment 5-Pol
MC 1,5/ 5-GF-3,5 + FK-MCP 1,5/ 5-STF-3,5; Manufacturer: Phoenix Contact; Ordering Number: 1843826 + 1940127; Datasheet Link: https://datasheet.datasheetarchive.com/originals/distributors/Datasheets-DGA26/1813160.pdf; Height: 9.35mm; Mouser Part Number: 651-1843253; Mouser Price/Stock: https://www.mouser.co.uk/ProductDetail/Phoenix-Contact/1843253?qs=qDEY8L%2Fo3POXxLCZiJq8WA%3D%3D; Arrow Part Number: 1843253; Arrow Price/Stock: https://www.arrow.com/en/products/1843253/phoenix-contact
footprint 1843826
pins: 1, 2, 3, 4, 5, MH1, MH2

## 1843839 + 1940130
designator X?, comment 6-Pol
MC 1,5/ 6-GF-3,5 + FK-MCP 1,5/ 6-STF-3,5; Manufacturer: Phoenix Contact; Ordering Number: 1843839 + 1940130; Datasheet Link: https://www.phoenixcontact.com/online/portal/pi/pxc/product_detail_page/!ut/p/z1/5VdNT-MwEP0r3UNvuHa-3WMJXShQtqi0NLlETjLpms0XiWmBX792m1VVBOGAOKwSWantzDzPe56pNNjHK-znbMPXTPAiZ6lce74dUP3KvTg3tSkxLyi5vZldj25vZ4Y-0vES-9ivIYVIQOwyAeuiesHe6PpafRAsxJ6uZmUU_cHeDG
footprint 1843839
pins: 1, 2, 3, 4, 5, 6, MH1, MH2

## 1843842 + 1940143
designator X?, comment 7-Pol, 90°
MC 1,5/ 7-GF-3,5 + FK-MCP 1,5/ 7-STF-3,5; Manufacturer: Phoenix Contact; Ordering Number: 1843842 + 1940143; Datasheet Link: https://www.phoenixcontact.com/online/portal/pi/pxc/product_detail_page/!ut/p/z1/5VdLT-MwEP4r3UNvuHbe7rGEAgUKRaXQ5BI5yaRrNi8S0wK_fu02qwpUwgFxWCWyEj9mPvv7PBNpsI-X2M_Zmq-Y4EXOUjn2fDug-qV7fmZqU2KeU3J7Pbsa3d7ODH2k43vsY7-GFCIBscsErIrqFXujqyu1IFiIPV31yij6g70Z0j; Height: 9.35mm; Arrow Part Number: 1843279; Arrow Price/Stock: https://www.arrow.com/en/products/1843279/phoenix-contact
footprint 1843842 MC 1,5/ 7-GF-3,5
pins: 1, 2, 3, 4, 5, 6, 7, MH1, MH2

## 1881590 + 1881367
designator X?, comment 6Pol
MCV 0,5/ 6-G-2,5 + FK-MC 0,5/ 6-ST-2,5; Manufacturer: Phoenix Contact; Ordering Number: 1881590 + 1881367; Height: 18.7mm
footprint 1881590 MCV 0,5/ 6-G-2,5 +1881367
pins: 1, 2, 3, 4, 5, 6

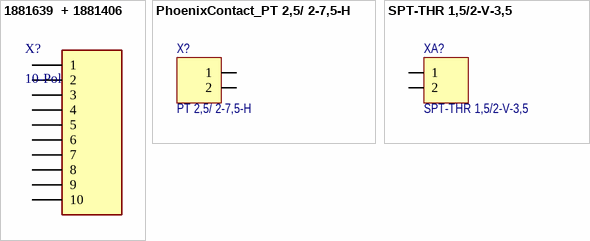
[diagram p3: symbols 1881639  + 1881406 to SPT-THR 1,5/2-V-3,5]

## 1881639  + 1881406
designator X?, comment 10-Pol
MCV 0,5/10-G-2,5 + FK-MC 0,5/10-ST-2,5; Manufacturer: Phoenix Contact; Ordering Number: 1881639  + 1881406; Height: 18.7mm
footprint 1881639 MCV 0,5/ 10-G-2,5 +1881406
pins: 1, 2, 3, 4, 5, 6, 7, 8, 9, 10

## PhoenixContact_PT 2,5/ 2-7,5-H
designator X?, comment PT 2,5/ 2-7,5-H
Screw compact terminal block; Manufacturer: Phoenix Contact; Part Number: 1988105; Part ID: PhoenixContact_PT 2,5/ 2-7,5-H; Price: 0,79; ComponentLink1Description: Datasheet; ComponentLink1URL: D:\Prj\_Altium\Lib\DbLib_Nieuwenhuizen\Datasheets\PhoenixContact\PhoenixContact_1988105_PT2,5_2-7,5-H.pdf; Value: PT 2,5/ 2-7,5-H
footprint PhoenixContact_PT 2,5/2-7,5-H
pins: 1, 2

## SPT-THR 1,5/2-V-3,5
designator XA?
Phoenix Contact SPT-THR 1,5/2-V-3,5; Ordering Number: 1823191; € / St.: 1,84; Manufacturer: Phoenix Contact; Value: SPT-THR 1,5/2-V-3,5
footprint SPT-THR 1,5/2-V-3,5 (Phoenix Contact SPT-THR 1,5/2-V-3,5)
pins: 1, 2


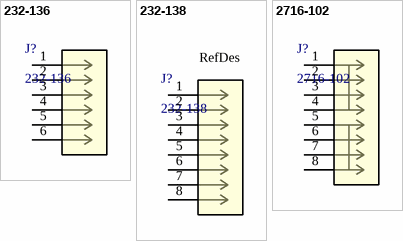
[diagram p4: symbols 232-136 to 2716-102]

## 232-136
designator J?
No Description Available; Manufacturer: Wago; Copyright: Copyright (C) 2022 Ultra Librarian. All rights reserved.; Ordering Number: 232-136; RefDes: RefDes; Type: DEV
footprint CONN_232-136_WAG
pins: 1, 2, 3, 4, 5, 6

## 232-138
designator J?
No Description Available; Manufacturer: Wago; Copyright: Copyright (C) 2022 Ultra Librarian. All rights reserved.; Ordering Number: 232-138; Type: DEV; RefDes: RefDes
footprint CONN_232-138_WAG
pins: 1, 2, 3, 4, 5, 6, 7, 8

## 2716-102
designator J?
No Description Available; Manufacturer: Wago; Copyright: Copyright (C) 2022 Ultra Librarian. All rights reserved.; Ordering Number: 2716-102; RefDes: RefDes; Type: DEV
footprint CONN08_2716-102_WAG
pins: 1, 2, 3, 4, 5, 6, 7, 8


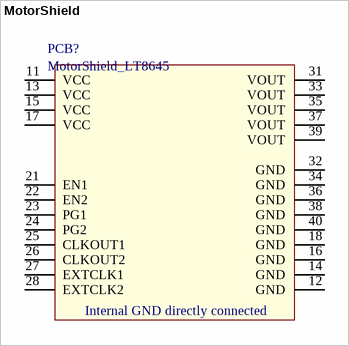
[diagram p5: symbol MotorShield]

## MotorShield
designator PCB?, comment MotorShield_LT8645
DCDC-8A / Spannung über beliebige Teiler
pins: 11 VCC, 12 GND, 13 VCC, 14 GND, 15 VCC, 16 GND, 17 VCC, 18 GND, 21 EN1, 22 EN2, 23 PG1, 24 PG2, 25 CLKOUT1, 26 CLKOUT2, 27 EXTCLK1, 28 EXTCLK2, 31 VOUT, 32 GND, 33 VOUT, 34 GND, 35 VOUT, 36 GND, 37 VOUT, 38 GND, 39 VOUT, 40 GND
text: Internal GND directly connected


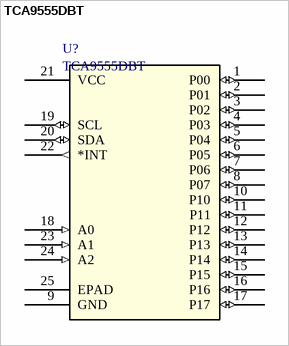
[diagram p6: symbol TCA9555DBT]

## TCA9555DBT
designator U?
TCA9555 Low-Voltage 16-Bit I2C and SMBus I/O / Expander with Interrupt Output and Configuration Registers; Manufacturer: Texas Instruments; Copyright: Copyright (C) 2023 Ultra Librarian. All rights reserved.; Manufacturer Part Number: TCA9555DBT; RefDes: RefDes; Type: DEV
footprint RTW24_2P45X2P45_TEX
pins: 1 P00 (io), 2 P01 (io), 3 P02 (io), 4 P03 (io), 5 P04 (io), 6 P05 (io), 7 P06 (io), 8 P07 (io), 9 GND (power), 10 P10 (io), 11 P11 (io), 12 P12 (io), 13 P13 (io), 14 P14 (io), 15 P15 (io), 16 P16 (io), 17 P17 (io), 18 A0 (in), 19 SCL (io), 20 SDA (io), 21 VCC (power), 22 *INT (out), 23 A1 (in), 24 A2 (in), 25 EPAD